# Altium footprint library Footprints.PcbLib: 17 footprints (part 1 of 2)
Each footprint in its own frame and in the unit in brackets; x right, y up, seen from the top. Pads: shape width x height; smd on the part's side, far side on the other; paste and mask are expansions set on the pad; w line width, h text height; cw(c..) or ccw(c..) is an arc to the next point about the centre after c.
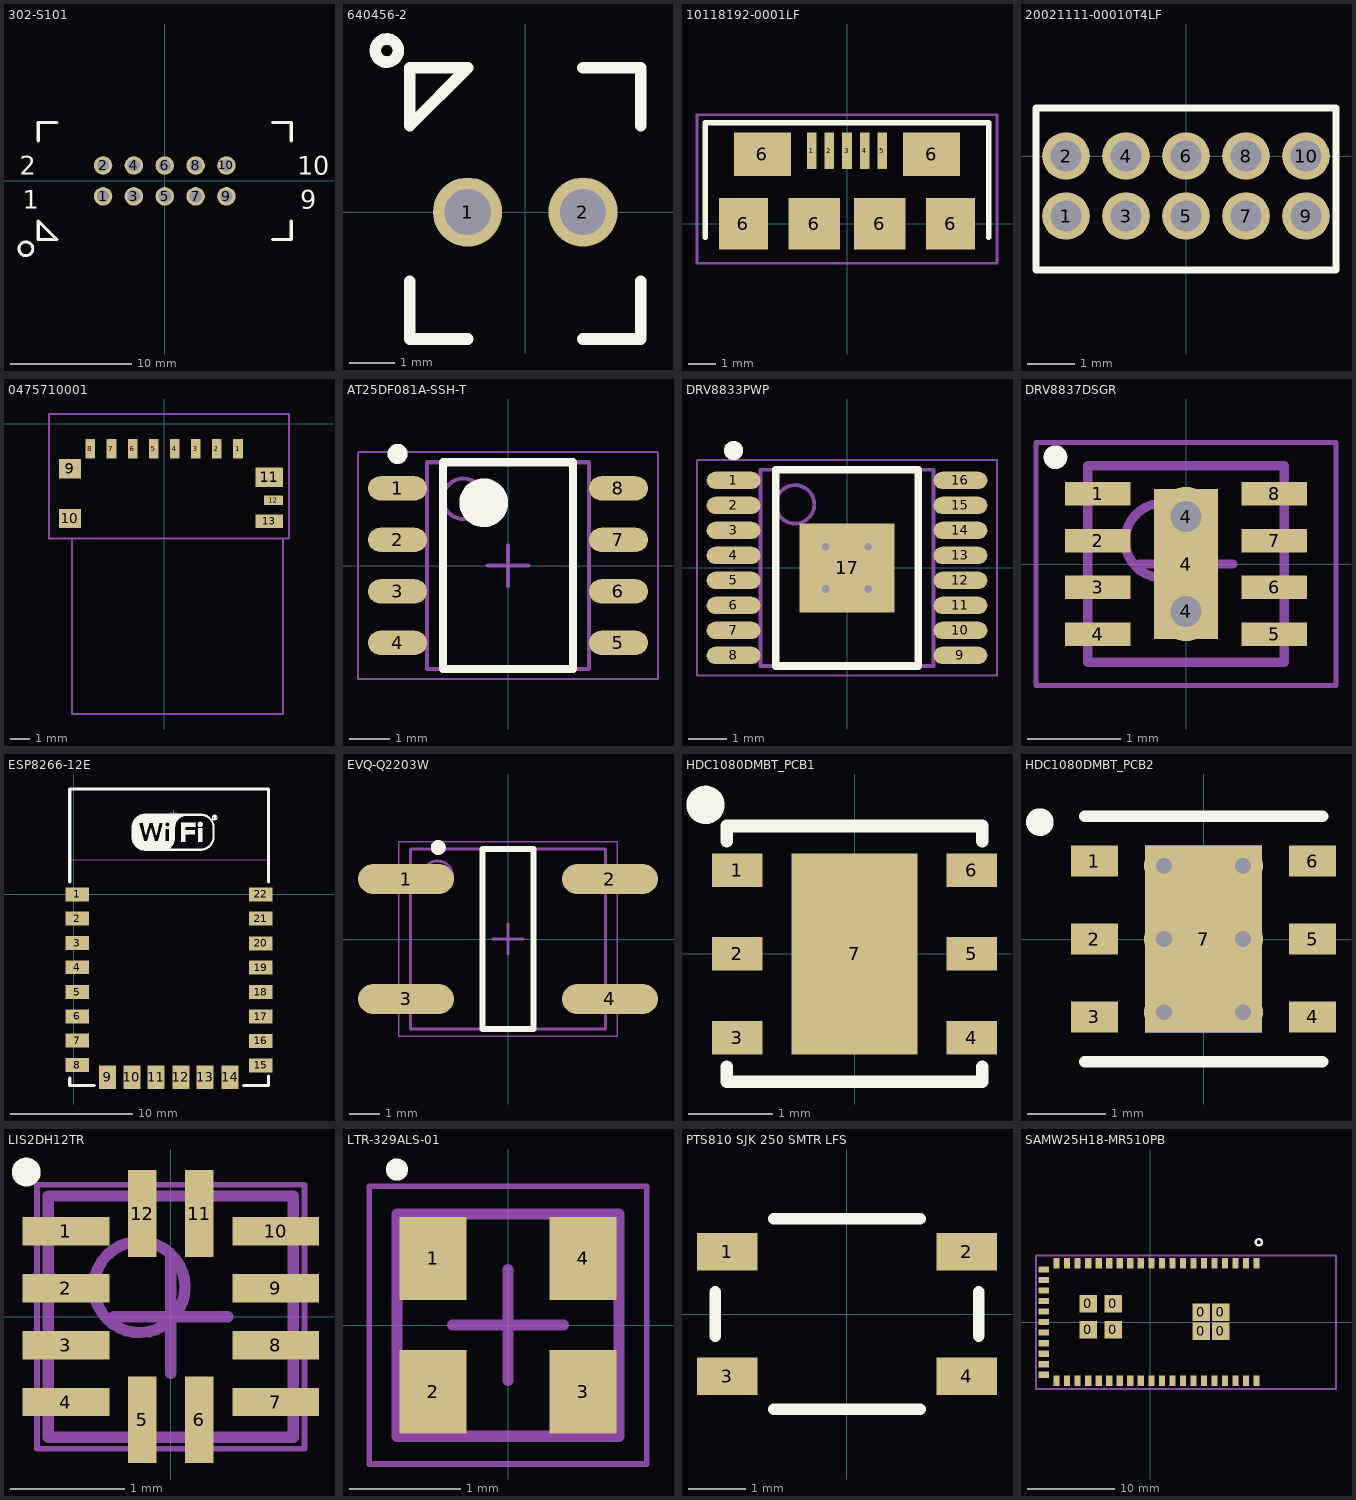
[diagram p0: the footprints below, top view; thin cyan lines are the x and y axes]

## 302-S101 [mil] "10 Positions Header, Shrouded Connector 0.100\" (2.54mm) Through Hole Gold"
pads (10):
  round 60 hole 40.16: 1(-200,-50) 2(-200,50) 3(-100,-50) 4(-100,50) 5(0,-50) 6(0,50) 7(100,-50) 8(100,50) 9(200,-50) 10(200,50)
Top Overlay:
  circle w10: c-450,-220 r22.36
  lines w10: -410,130 -410,190 -350,190 ; 350,-190 410,-190 410,-130 ; 350,190 410,190 410,130 ; -410,-190 -410,-130 -350,-190 -410,-190
  text "10" at 430,20 h60
  text "9" at 440,-90 h60
  text "1" at -460,-90 h60
  text "2" at -470,20 h60
Bottom Overlay:
  circle w10: c-450,-220 r22.36
  lines w10: -410,130 -410,190 -350,190 ; 350,-190 410,-190 410,-130 ; 350,190 410,190 410,130 ; -410,-190 -350,-190 -410,-130 -410,-190
  text "10" at 520,20 h60
  text "9" at 480,-90 h60
  text "2" at -430,20 h60
  text "1" at -440,-90 h60
3D body "3020-10-0100-xx.STEP": height 350.39, standoff -118.11, extent -399.99,-174.4 400.01,181.11

## 640456-2 [mil] "CONN HEADER VERT 2POS .100 TIN"
pads (2):
  round 60 hole 40.16: 1(-50,0) 2(50,0)
Top Overlay:
  circle w10: c-120,140 r10
  lines w10: -100,-60 -100,-110 -50,-110 ; 50,-110 100,-110 100,-60 ; 50,125 100,125 100,75 ; -100,75 -100,125 -50,125 -100,75
Bottom Overlay:
  circle w10: c-120,140 r10
  lines w10: -100,-60 -100,-110 -50,-110 ; 50,-110 100,-110 100,-60 ; 50,125 100,125 100,75 ; -100,75 -50,125 -100,125 -100,75
3D body "c-640456-2-aa-3d.stp": height 395, standoff -140, extent -99.99,-107.49 100.01,122.51

## 10118192-0001LF [mm]
pads (11):
  rect 0.35x1.35 smd: 1(-1.3,2.675) 2(-0.65,2.675) 3(0,2.675) 4(0.65,2.675) 5(1.3,2.675)
  rect 1.8x1.9 smd: 6(-3.8,0) 6(3.8,0)
  rect 2.1x1.6 smd: 6(-3.1,2.55) 6(3.1,2.55)
  rect 1.9x1.9 smd: 6(-1.2,0) 6(1.2,0)
Top Overlay:
  lines w0.203: -5.2,-0.5 -5.2,3.7 5.2,3.7 5.2,-0.5
Mechanical 4:
  lines w0.102: -5.5,-1.45 -5.5,4 5.5,4 5.5,-1.45 5,-1.45 -5.5,-1.45
  text "BOARD EDGE" at -2.65,-2.1 h0.5
3D body "10118192C.stp": height 2.79, standoff -0.22, extent -3.956,-2.761 3.956,2.9

## 20021111-00010T4LF [mm] "CONN HEADER 10POS UNSHD VERT T/H"
pads (10):
  round 1.006 hole 0.65: 1(-2.54,-1.27) 2(-2.54,0) 3(-1.27,-1.27) 4(-1.27,0) 5(0,-1.27) 6(0,0) 7(1.27,-1.27) 8(1.27,0) 9(2.54,-1.27) 10(2.54,0)
Top Overlay:
  lines w0.152: -3.175,-2.413 -3.175,1.016 3.175,1.016 3.175,-2.413 -3.175,-2.413
3D body "10posheader.STEP": height 5.5, standoff -2.35, extent -3.175,-2.335 3.175,1.065

## 0475710001 [mm]
height 2.54
pads (13):
  rect 0.5x1 smd: 1(3.85,-1.31) 2(2.75,-1.31) 3(1.65,-1.31) 4(0.55,-1.31) 5(-0.55,-1.31) 6(-1.65,-1.31) 7(-2.75,-1.31) 8(-3.85,-1.31)
  rect 1.15x1 smd: 9(-4.925,-2.36) 10(-4.925,-4.95)
  rect 1.45x1 smd: 11(5.475,-2.8)
  rect 1x0.5 smd: 12(5.7,-4)
  rect 1.45x0.7 smd: 13(5.475,-5.1)
Mechanical 4:
  lines w0.102: -4.8,-6 -4.8,-15.15 6.2,-15.15 6.2,-6 ; -6,-6 -6,-5.5 -6,0.5 6.5,0.5 6.5,-6 -6,-6
  text "card position" at -3.2,-14.8 h0.7
3D body "475710001.stp": height 2.28, standoff -0.01, extent -5.375,-5.375 6.025,0.075

## AT25DF081A-SSH-T [mm] "IC FLASH 8MBIT 100MHZ 8SOIC"
height 1.75
pads (8):
  oval 1.45x0.6 smd: 1(-2.725,1.905) 2(-2.725,0.635) 3(-2.725,-0.635) 4(-2.725,-1.905) 5(2.725,-1.905) 6(2.725,-0.635) 7(2.725,0.635) 8(2.725,1.905)
Top Overlay:
  circle w0.6: c-0.6,1.55 r0.3
  circle w0.25: c-2.725,2.755 r0.125
  lines w0.2: -1.6,-2.55 1.6,-2.55 1.6,2.55 -1.6,2.55 -1.6,-2.55
Mechanical 13:
  circle w0.1: c-1.1,1.65 r0.5
  lines w0.1: -2,-2.55 2,-2.55 2,2.55 -2,2.55 -2,-2.55
Mechanical 15:
  lines w0.05: -3.7,-2.8 3.7,-2.8 3.7,2.8 -3.7,2.8 -3.7,-2.8
  lines w0.1: -0.5,0 0.5,0 ; 0,-0.5 0,0.5
3D body "SOIC127P600X175-8N.step": height 1.75, standoff 0, extent -2.997,-2.55 2.997,2.55

## DRV8833PWP [mm] "2A Low Voltage Dual Brushed DC or Single Bipolar Stepper Motor Driver (PWM Ctrl) 16-HTSSOP -40 to 85"
height 1.2
pads (17):
  oval 1.4x0.45 smd: 1(-2.95,2.275) 2(-2.95,1.625) 3(-2.95,0.975) 4(-2.95,0.325) 5(-2.95,-0.325) 6(-2.95,-0.975) 7(-2.95,-1.625) 8(-2.95,-2.275) 9(2.95,-2.275) 10(2.95,-1.625) 11(2.95,-0.975) 12(2.95,-0.325) 13(2.95,0.325) 14(2.95,0.975) 15(2.95,1.625) 16(2.95,2.275)
  rect 2.46x2.31 smd: 17(0,0)
via -0.55,0.55 diameter 0.5 hole 0.2
via 0.55,0.55 diameter 0.5 hole 0.2
via -0.55,-0.55 diameter 0.5 hole 0.2
via 0.55,-0.55 diameter 0.5 hole 0.2
Top Overlay:
  circle w0.25: c-2.95,3.05 r0.125
  lines w0.2: -1.85,-2.55 -1.85,2.55 1.85,2.55 1.85,-2.55 -1.85,-2.55
Mechanical 13:
  circle w0.1: c-1.35,1.65 r0.5
  lines w0.1: -2.25,-2.55 -2.25,2.55 2.25,2.55 2.25,-2.55 -2.25,-2.55
Mechanical 15:
  lines w0.05: -3.9,-2.8 -3.9,2.8 3.9,2.8 3.9,-2.8 -3.9,-2.8
  lines w0.1: -0.5,0 0.5,0 ; 0,-0.5 0,0.5
3D body "DRV8833PWP.step": height 1.2, standoff 0, extent -3.2,-2.55 3.2,2.55

## DRV8837DSGR [mm] "Half Bridge (2) Driver DC Motors, Solenoids NMOS 8-WSON (2x2)"
pads (11):
  rect 0.7x0.25 smd mask+0: 1(-0.945,0.75) 2(-0.945,0.25) 3(-0.945,-0.25) 4(-0.945,-0.75) 5(0.945,-0.75) 6(0.945,-0.25) 7(0.945,0.25) 8(0.945,0.75)
  round 0.635 hole 0.33 mask+0: 4(0,-0.508) 4(0,0.508)
  rect 0.69x1.6 smd: 4(0,0)
Top Overlay:
  circle w0.127: c-1.397,1.143 r0.064
Mechanical 13:
  circle w0.1: c-0.25,0.25 r0.4
  lines w0.1: -1.05,-1.05 1.05,-1.05 1.05,1.05 -1.05,1.05 -1.05,-1.05
Mechanical 15:
  lines w0.05: -1.605,-1.3 1.605,-1.3 1.605,1.3 -1.605,1.3 -1.605,-1.3
  lines w0.1: -0.5,0 0.5,0 ; 0,-0.5 0,0.5
3D body: height 0.8, standoff 0, extent -1.05,-1.05 1.05,1.05

## ESP8266-12E [mil] "ESP8266-12E"
pads (22):
  rect 75x45 smd: 1(12.5,0) 2(12.5,-78) 3(12.5,-157) 4(12.5,-235) 5(12.5,-315) 6(12.5,-393) 7(12.5,-471) 8(12.5,-550) 15(602.5,-551) 16(602.5,-472) 17(602.5,-394) 18(602.5,-315) 19(602.5,-236) 20(602.5,-158) 21(602.5,-78) 22(602.5,0)
  rect 55x75 smd: 9(110,-589.5) 10(188,-589.5) 11(266,-589.5) 12(346,-589.5) 13(424,-589.5) 14(504,-589.5)
Top Overlay:
  drawing of 1267 lines, arcs and shapes, not listed
Mechanical 13:
  lines w2: -9.96,111.97 630.04,111.97
  text "ANTENNA AREA" at 0.04,314.59 h10
  text "CUTOUT POLYGON" at 0.04,294.59 h10
Mechanical 15:
  lines w3.94: 312,261.92 332,261.92 ; 322,251.92 322,271.92
3D body "ESP_12_ENew.STEP": height 150.35, standoff -1.94, extent -8.24,-611 622.24,335.09

## EVQ-Q2203W [mm] "SWITCH TACTILE SPST-NO 0.02A 15V, SOJ, 4-Leads, Body 6.00x6.60mm, Pitch 4.00mm, IPC Medium Density"
height 3.1
pads (4):
  oval 3.2x1 smd: 1(-3.4,2) 2(3.4,2) 3(-3.4,-2) 4(3.4,-2)
Top Overlay:
  circle w0.25: c-2.325,3.05 r0.125
  lines w0.2: -0.85,-3 -0.85,3 0.85,3 0.85,-3 -0.85,-3
Mechanical 13:
  circle w0.1: c-2.35,2.1 r0.5
  lines w0.1: -3.25,-3 -3.25,3 3.25,3 3.25,-3 -3.25,-3
Mechanical 15:
  lines w0.05: -3.65,-3.25 -3.65,3.25 3.65,3.25 3.65,-3.25 -3.65,-3.25
  lines w0.1: -0.5,0 0.5,0 ; 0,-0.5 0,0.5
3D body "EVQQ2203W.STEP": height 3.11, standoff 0.01, extent -3.275,-2.925 3.325,3.075

## HDC1080DMBT_PCB1 [mm] "SENSOR HUMI/TEMP 3.3V I2C 2% SMD"
pads (7):
  rect 0.6x0.4 smd paste+0 mask+0.051: 1(-1.4,1) 2(-1.4,0) 3(-1.4,-1) 4(1.4,-1) 5(1.4,0) 6(1.4,1)
  rect 1.5x2.4 smd paste-1.187 mask+0.051: 7(0,0)
Top Overlay:
  circle w0.254: c-1.778,1.778 r0.102
  lines w0.152: -1.525,-1.346 -1.525,-1.525 1.525,-1.525 1.525,-1.346 ; -1.525,1.346 -1.525,1.525 1.525,1.525 1.525,1.346
Top Paste:
  region: -0.695,1.065 -0.695,0.1 0.695,0.1 0.695,1.065
  region: -0.695,-0.1 -0.695,-1.065 0.695,-1.065 0.695,-0.1
3D body "DMB0006A.stp": height 0.8, standoff 0, extent -1.5,-1.5 1.5,1.5

## HDC1080DMBT_PCB2 [mm] "SENSOR HUMI/TEMP 3.3V I2C 2% SMD"
pads (8):
  rect 0.6x0.4 smd paste+0 mask+0.051: 1(-1.4,1) 2(-1.4,0) 3(-1.4,-1) 4(1.4,-1) 5(1.4,0) 6(1.4,1)
  rect 1.5x2.4 smd paste-1.187 mask+0.051: 7(0,0)
  rect 1.5x2.4 smd far side: 7(0,0)
via 0.508,0.94 diameter 0.508 hole 0.203
via 0.508,0 diameter 0.508 hole 0.203
via 0.508,-0.94 diameter 0.508 hole 0.203
via -0.508,-0.94 diameter 0.508 hole 0.203
via -0.508,0 diameter 0.508 hole 0.203
via -0.508,0.94 diameter 0.508 hole 0.203
Top Overlay:
  circle w0.254: c-2.1,1.5 r0.05
  lines w0.152: -1.525,-1.575 1.525,-1.575 ; -1.525,1.575 1.525,1.575
Top Paste:
  region: -0.69,1.16 -0.69,0.1 0.69,0.1 0.69,1.16
  region: -0.69,-0.1 -0.69,-1.16 0.69,-1.16 0.69,-0.1
3D body "DMB0006A.stp": height 0.8, standoff 0, extent -1.5,-1.5 1.5,1.5

## LIS2DH12TR [mm] "ACCEL 2-16G I2C/SPI 12LGA"
pads (12):
  rect 0.762x0.25 smd: 1(-0.921,0.75) 2(-0.921,0.25) 3(-0.921,-0.25) 4(-0.921,-0.75) 7(0.921,-0.75) 8(0.921,-0.25) 9(0.921,0.25) 10(0.921,0.75)
  rect 0.25x0.762 smd: 5(-0.25,-0.906) 6(0.25,-0.906) 11(0.25,0.906) 12(-0.25,0.906)
Top Overlay:
  lines w0.127: -1.206,1.27 cw(c-1.27,1.27) -1.207,1.277
Mechanical 13:
  circle w0.1: c-0.275,0.26 r0.4
  lines w0.1: -1.075,-1.06 1.075,-1.06 1.075,1.06 -1.075,1.06 -1.075,-1.06
Mechanical 15:
  lines w0.05: -1.175,-1.16 1.175,-1.16 1.175,1.16 -1.175,1.16 -1.175,-1.16
  lines w0.1: -0.5,0 0.5,0 ; 0,-0.5 0,0.5
3D body: height 1, standoff 0.2, extent -1.075,-1.06 1.075,1.06

## LTR-329ALS-01 [mm] "AMBIENT LIGHT PHOTO SENSOR Optical Sensor Ambient I²C 4-VDFN"
height 0.7
pads (4):
  rect 0.6x0.75 smd: 1(-0.675,0.6) 2(-0.675,-0.6) 3(0.675,-0.6) 4(0.675,0.6)
Top Overlay:
  circle w0.1: c-1,1.4 r0.05
Mechanical 13:
  lines w0.1: -1,-1 -1,1 1,1 1,-1 -1,-1
Mechanical 15:
  lines w0.05: -1.25,-1.25 -1.25,1.25 1.25,1.25 1.25,-1.25 -1.25,-1.25
  lines w0.1: -0.5,0 0.5,0 ; 0,-0.5 0,0.5
3D body "LTR-329ALS-01.step": height 0.7, standoff 0, extent -1,-1 1,1

## PTS810 SJK 250 SMTR LFS [mm] "SWITCH TACTILE SPST-NO 0.05A 16V"
pads (4):
  rect 1.05x0.65 smd: 1(-2.075,1.075) 2(2.075,1.075) 3(-2.075,-1.075) 4(2.075,-1.075)
Top Overlay:
  lines w0.203: -2.286,-0.381 -2.286,0.381 ; -1.27,-1.651 1.27,-1.651 ; -1.27,1.651 1.27,1.651 ; 2.286,-0.381 2.286,0.381
3D body "PTS810 CK Switch.STEP": height 2.5, standoff 0, extent -2.3,-1.6 2.3,1.6

## SAMW25H18-MR510PB [mm] "RF TXRX MODULE WIFI TRACE ANT"
pads (59):
  rect 2x2 smd: 0(-7.065,-0.839) 0(-7.065,2.085) 0(-4.21,-0.839) 0(-4.21,2.085) 0(5.828,-1.045) 0(5.828,1.137) 0(8.046,-1.045) 0(8.046,1.137)
  rect 0.7x1.2 smd: 1(12.121,6.7) 2(10.921,6.7) 3(9.721,6.7) 4(8.521,6.7) 5(7.321,6.7) 6(6.121,6.7) 7(4.921,6.7) 8(3.721,6.7) 9(2.521,6.7) 10(1.321,6.7) 11(0.121,6.7) 12(-1.079,6.7) 13(-2.279,6.7) 14(-3.479,6.7) 15(-4.679,6.7) 16(-5.879,6.7) 17(-7.079,6.7) 18(-8.279,6.7) 19(-9.479,6.7) 20(-10.679,6.7) 32(-10.679,-6.7) 33(-9.479,-6.7) 34(-8.279,-6.7) 35(-7.079,-6.7) 36(-5.879,-6.7) 37(-4.679,-6.7) 38(-3.479,-6.7) 39(-2.279,-6.7) 40(-1.079,-6.7) 41(0.121,-6.7) 42(1.321,-6.7) 43(2.521,-6.7) 44(3.721,-6.7) 45(4.921,-6.7) 46(6.121,-6.7) 47(7.321,-6.7) 48(8.521,-6.7) 49(9.721,-6.7) 50(10.921,-6.7) 51(12.121,-6.7)
  rect 1.2x0.7 smd: 21(-12.12,6.004) 22(-12.12,4.804) 23(-12.12,3.604) 24(-12.12,2.404) 25(-12.12,1.204) 26(-12.12,0.004) 27(-12.12,-1.196) 28(-12.12,-2.396) 29(-12.12,-3.596) 30(-12.12,-4.796) 31(-12.12,-5.996)
Top Overlay:
  circle w0.254: c12.382,9.118 r0.358
Mechanical 3:
  lines w0.254: -13.031,-7.612 -13.031,7.597 21.179,7.597 21.179,-7.612 -13.031,-7.612
3D body "SAMW25.STEP": height 3.37, standoff -0.03, extent -12.885,-7.452 20.978,7.455